# Altium footprint library 1.30-二极管-整流桥堆.PcbLib: 58 footprints (part 4 of 4)
Each footprint in its own frame and in the unit in brackets; x right, y up, seen from the top. Pads: shape width x height; smd on the part's side, far side on the other; paste and mask are expansions set on the pad; w line width, h text height; cw(c..) or ccw(c..) is an arc to the next point about the centre after c.
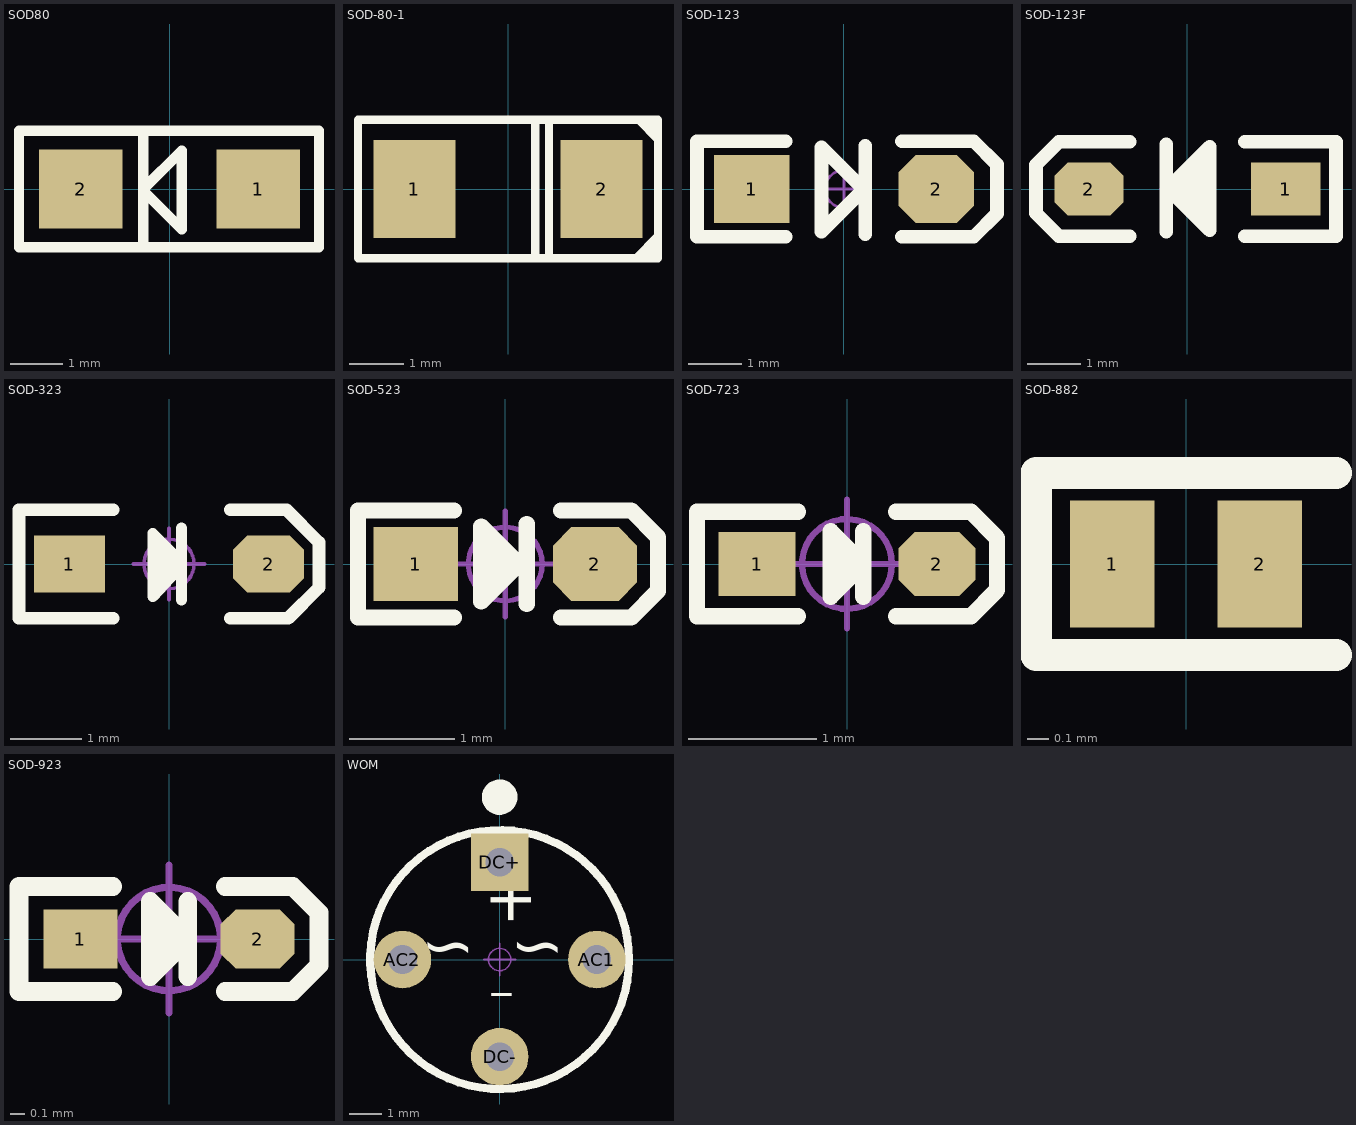
[diagram p3: the footprints below, top view; thin cyan lines are the x and y axes]

## SOD80 [mm] "LL34"
pads (2):
  rect 1.6x1.524 smd: 1(1.7,0) 2(-1.7,0)
Top Overlay:
  lines w0.2: -2.888,1.092 -2.888,-1.118 2.868,-1.118 2.868,1.067 ; -2.888,1.118 2.868,1.118 ; -0.5,-1.118 -0.5,1.118 ; -0.5,-0.035 0.237,-0.772 0.237,0.737 -0.5,0 -0.5,-0.035
3D body "SOD-80.STEP": height 1.5, standoff 0, extent -1.828,-0.75 1.672,0.75

## SOD-80-1 [mm]
pads (2):
  rect 1.5x1.8 smd: 1(-1.714,0) 2(1.714,0)
Top Overlay:
  lines w0.15: 0.5,-1.27 0.5,1.27 ; 0.75,-1.27 0.75,1.27 ; 2.344,-1.27 2.75,-0.864 ; 2.391,1.27 2.75,0.909 ; 2.548,1.215 2.698,1.065 ; 2.552,-1.211 2.674,-1.089 ; -2.75,-1.27 -2.75,1.27 2.75,1.27 2.75,-1.27 -2.75,-1.27
3D body "SOD-80.STEP": height 1.5, standoff 0, extent -1.686,-0.75 1.814,0.75

## SOD-123 [mil] "2.7x1.6X1.1mm（长宽高，不包括引脚） 淘宝ID:黄晶宝石"
pads (2):
  rect 55x50 smd: 1(-67.5,0)
  oct 55x50 smd: 2(67.5,0)
Top Overlay:
  lines w10: -42.5,-35 -107.5,-35 -107.5,35 -42.5,35 ; 14,-0.8 -16.4,-31.2 -16.4,30.5 15.6,-1.5 ; 15.6,-33.1 15.6,31.7 ; 42.5,-35 95,-35 112,-18 112,18 95,35 42.5,35
Mechanical 15:
  circle w1.97: c0,0 r13.78
  lines w1.97: -19.68,0 19.68,0 ; 0,-19.68 0,19.68
3D body "SOD-123.stp": height 50, standoff 1.97, extent -72.84,-31.5 72.83,31.49

## SOD-123F [mm] "2.7x1.6X1.1mm（长宽高，不包括引脚）"
pads (2):
  rect 1.3x1 smd: 1(1.85,0)
  oct 1.3x1 smd: 2(-1.85,0)
Top Overlay:
  lines w0.254: -1.079,-0.889 -2.413,-0.889 -2.845,-0.457 -2.845,0.457 -2.413,0.889 -1.079,0.889 ; -0.396,-0.805 -0.396,0.841 ; -0.396,0.038 0.417,-0.775 0.417,0.792 -0.356,0.02 ; 0,0.254 0,0 0,-0.254 -0.254,0 0.229,0.432 0.254,-0.559 ; 1.079,-0.889 2.794,-0.889 2.794,0.889 1.079,0.889
Mechanical 15:
  circle w0.05: c0,0 r0.35
  lines w0.05: -0.5,0 0.5,0 ; 0,-0.5 0,0.5
3D body "SOD-123F.stp": height 1.15, standoff 0.05, extent -1.9,-0.8 1.9,0.8

## SOD-323 [mm] "1.8x1.3X0.9mm（长宽高，不包括引脚）"
pads (2):
  rect 1x0.8 smd: 1(-1.4,0)
  oct 1x0.8 smd: 2(1.4,0)
Top Overlay:
  lines w0.152: 0.178,-0.508 0.178,0.508 ; 0.178,-0.025 -0.229,-0.457 -0.229,0.432 0.178,0.025
  lines w0.178: -0.787,-0.762 -2.108,-0.762 -2.108,0.762 -0.787,0.762 ; 0.864,-0.762 1.676,-0.762 2.108,-0.33 2.108,0.305 1.651,0.762 0.864,0.762
  lines w0.254: -0.127,0.254 -0.152,-0.178 0.025,-0.025 -0.025,0.127
Mechanical 15:
  circle w0.05: c0,0 r0.35
  lines w0.05: -0.5,0 0.5,0 ; 0,-0.5 0,0.5
3D body "SOD-323.STEP": height 0.95, standoff 0, extent -1.324,-0.65 1.324,0.65

## SOD-523 [mm] "1.2x0.8X0.6mm（长宽高，不包括引脚）"
pads (2):
  rect 0.8x0.7 smd: 1(-0.85,0)
  oct 0.8x0.7 smd: 2(0.85,0)
Top Overlay:
  rectangle: -0.178,-0.178 0,0.178
  lines w0.152: -0.488,-0.508 -1.397,-0.508 -1.397,0.508 -0.488,0.508 ; -0.127,0 0.127,0 ; 0.203,-0.381 0.203,0.381 ; 0.528,-0.508 1.194,-0.508 1.448,-0.254 1.448,0.254 1.194,0.508 0.528,0.508 ; 0.127,0 -0.229,-0.356 -0.229,0.356 0.127,0
Mechanical 15:
  circle w0.05: c0,0 r0.35
  lines w0.05: -0.5,0 0.5,0 ; 0,-0.5 0,0.5
3D body "SOD-523.stp": height 0.65, standoff 0.05, extent -0.8,-0.4 0.8,0.4

## SOD-723 [mm] "1x0.6X0.5mm（长宽高，不包括引脚）"
pads (2):
  rect 0.6x0.5 smd: 1(-0.7,0)
  oct 0.6x0.5 smd: 2(0.7,0)
Top Overlay:
  lines w0.127: -0.381,-0.406 -1.168,-0.406 -1.168,0.406 -0.381,0.406 ; 0,-0.127 0,0.127 -0.127,0.254 ; 0.127,-0.254 0.127,0.254 ; 0.381,-0.406 0.965,-0.406 1.168,-0.203 1.168,0.203 0.965,0.406 0.381,0.406 ; -0.127,0.254 0.127,0 -0.127,-0.254 -0.127,0.254
Mechanical 15:
  circle w0.05: c0,0 r0.35
  lines w0.05: -0.5,0 0.5,0 ; 0,-0.5 0,0.5
3D body "SOD-723.STEP": height 0.55, standoff 0.05, extent -0.7,-0.3 0.7,0.3

## SOD-882 [mm]
height 0.5
pads (2):
  rect 0.4x0.6 smd: 1(-0.35,0) 2(0.35,0)
Top Overlay:
  lines w0.152: 0.711,-0.432 -0.711,-0.432 -0.711,0.432 0.711,0.432
3D body "SOD-882.STEP": height 0.5, standoff 0, extent -0.52,-0.32 0.52,0.32

## SOD-923 [mm] "0.8x0.6X0.4mm（长宽高，不包括引脚）       淘宝ID:黄晶宝石"
pads (2):
  rect 0.5x0.4 smd: 1(-0.6,0)
  oct 0.5x0.4 smd: 2(0.6,0)
Top Overlay:
  lines w0.127: -0.381,-0.356 -1.016,-0.356 -1.016,0.356 -0.381,0.356 ; 0,-0.127 0,0.127 -0.127,0.254 ; 0.127,-0.254 0.127,0.254 ; 0.381,-0.356 0.838,-0.356 1.016,-0.178 1.016,0.178 0.838,0.356 0.381,0.356 ; -0.127,0.254 0.127,0 -0.127,-0.254 -0.127,0.254
Mechanical 15:
  circle w0.05: c0,0 r0.35
  lines w0.05: -0.5,0 0.5,0 ; 0,-0.5 0,0.5
3D body "SOD-923.STEP": height 0.43, standoff 0.02, extent -0.5,-0.3 0.5,0.3

## WOM [mm] "8.1*5.1mm(直径，高)"
pads (4):
  round 1.8 hole 0.9: AC1(3.04,0) AC2(-3.04,0) DC-(0,-3.04)
  rect 1.8x1.8 hole 0.9: DC+(0,3.04)
Top Overlay:
  circle w0.6: c0,5.08 r0.254
  circle w0.254: c0,0 r4.05
  text "+" at -0.762,1.016 h2.54
  text "-" at 0.508,-2.286 h3.05
  text "~" at 2.032,-0.762 h2.54
  text "~" at -0.762,-0.762 h2.54
Mechanical 15:
  circle w0.05: c0,0 r0.35
  lines w0.05: -0.5,0 0.5,0 ; 0,-0.5 0,0.5
3D body "wom_asm.stp": height 5.15, standoff -3.45, extent -4.05,-4.05 4.05,4.05